# Altium footprint library Cyberdeck.PcbLib: 261 footprints (part 11 of 17)
Each footprint in its own frame and in the unit in brackets; x right, y up, seen from the top. Pads: shape width x height; smd on the part's side, far side on the other; paste and mask are expansions set on the pad; w line width, h text height; cw(c..) or ccw(c..) is an arc to the next point about the centre after c.
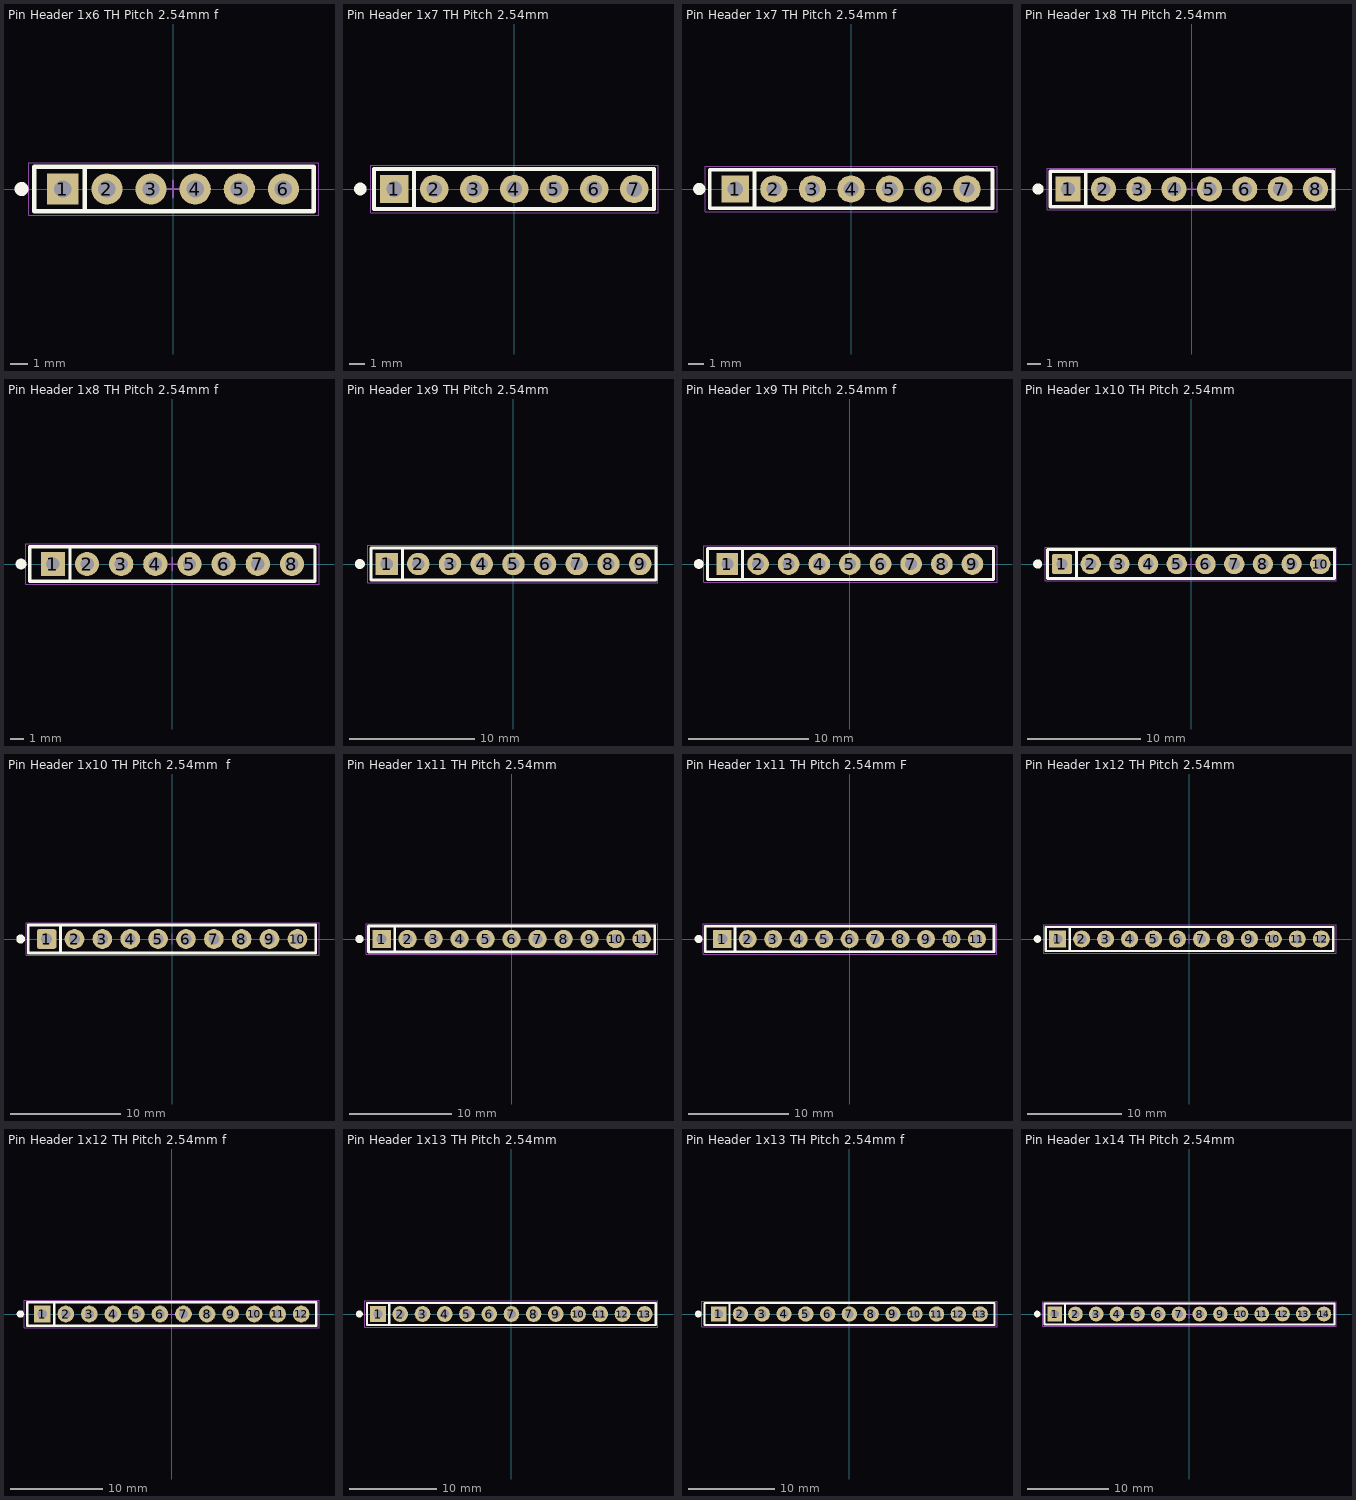
[diagram p10: the footprints below, top view; thin cyan lines are the x and y axes]

## Pin Header 1x6 TH Pitch 2.54mm f [mm] "PinHeader 1x6 TH Pitch 2.54mm female"
height 9.5
pads (6):
  rect 1.8x1.8 hole 1: 1(-6.35,0)
  round 1.8 hole 1: 2(-3.81,0) 3(-1.27,0) 4(1.27,0) 5(3.81,0) 6(6.35,0)
Top Overlay:
  circle w0.5: c-8.72,0 r0.15
  lines w0.254: -7.62,1.27 8.1,1.27 8.1,-1.27 -8,-1.27 -8,1.27 -5.08,1.27 -5.08,-1.27
Assembly Top:
  lines w0.1: -8.02,-1.27 -8.02,1.27 8.02,1.27 8.02,-1.27 -8.02,-1.27
Courtyard Top:
  lines w0.05: -8.3,-1.5 8.4,-1.5 8.4,1.5 -8.3,1.5 -8.3,-1.5
  lines w0.1: -0.5,0 0.5,0 ; 0,-0.5 0,0.5
3D body "DS1023-1x6SF11.stp": height 8.5, standoff -3, extent -8.02,-1.27 8.02,1.27

## Pin Header 1x7 TH Pitch 2.54mm [mm] "PinHeader 1x7 TH Pitch 2.54mm"
height 9.5
pads (7):
  rect 1.8x1.8 hole 1: 1(-7.62,0)
  round 1.8 hole 1: 2(-5.08,0) 3(-2.54,0) 4(0,0) 5(2.54,0) 6(5.08,0) 7(7.62,0)
Top Overlay:
  circle w0.5: c-9.77,0 r0.15
  lines w0.254: -6.35,-1.27 -6.35,1.27 -8.89,1.27 ; -8.89,1.27 8.89,1.27 8.89,-1.27 -8.89,-1.27 -8.89,1.27
Assembly Top:
  lines w0.1: -8.89,1.2 -8.82,1.27 8.89,1.27 8.89,-1.27 -8.89,-1.27 -8.89,1.27
Courtyard Top:
  lines w0.05: -9.12,-1.5 9.13,-1.5 9.13,1.5 -9.12,1.5 -9.12,-1.5
  lines w0.1: -0.5,0 0.5,0 ; 0,-0.5 0,0.5
3D body "DS1021-1x7SF11.stp": height 8.6, standoff -3, extent -8.89,-1.27 8.89,1.27

## Pin Header 1x7 TH Pitch 2.54mm f [mm] "PinHeader 1x7 TH Pitch 2.54mm female"
height 9.5
pads (7):
  rect 1.8x1.8 hole 1: 1(-7.62,0)
  round 1.8 hole 1: 2(-5.08,0) 3(-2.54,0) 4(0,0) 5(2.54,0) 6(5.08,0) 7(7.62,0)
Top Overlay:
  circle w0.5: c-9.99,0 r0.15
  lines w0.254: -8.89,1.27 9.3,1.27 9.3,-1.27 -9.3,-1.27 -9.3,1.27 -6.35,1.27 -6.35,-1.27
Assembly Top:
  lines w0.1: -9.29,-1.27 -9.29,1.27 9.29,1.27 9.29,-1.27 -9.29,-1.27
Courtyard Top:
  lines w0.05: -9.6,-1.5 -9.6,1.5 9.6,1.5 9.6,-1.5 -9.6,-1.5
  lines w0.1: -0.5,0 0.5,0 ; 0,-0.5 0,0.5
3D body "DS1023-1x7SF11.stp": height 8.5, standoff -3, extent -9.29,-1.27 9.29,1.27

## Pin Header 1x8 TH Pitch 2.54mm [mm] "PinHeader 1x8 TH Pitch 2.54mm"
height 9.5
pads (8):
  rect 1.8x1.8 hole 1: 1(-8.89,0)
  round 1.8 hole 1: 2(-6.35,0) 3(-3.81,0) 4(-1.27,0) 5(1.27,0) 6(3.81,0) 7(6.35,0) 8(8.89,0)
Top Overlay:
  circle w0.5: c-11.04,0 r0.15
  lines w0.254: -7.62,-1.27 -7.62,1.27 -10.16,1.27 ; -10.16,1.27 -10.16,-1.27 10.16,-1.27 10.16,1.27 -10.16,1.27
Assembly Top:
  lines w0.1: -10.16,-1.27 10.16,-1.27 10.16,1.27 -10.16,1.27 -10.16,-1.27
Courtyard Top:
  lines w0.05: -10.39,-1.5 10.36,-1.5 10.36,1.5 -10.39,1.5 -10.39,-1.5
  lines w0.1: -0.5,0 0.5,0 ; 0,-0.5 0,0.5
3D body "DS1021-1x8SF11.stp": height 8.6, standoff -3, extent -10.16,-1.27 10.16,1.27

## Pin Header 1x8 TH Pitch 2.54mm f [mm] "PinHeader 1x8 TH Pitch 2.54mm female"
height 9.5
pads (8):
  rect 1.8x1.8 hole 1: 1(-8.89,0)
  round 1.8 hole 1: 2(-6.35,0) 3(-3.81,0) 4(-1.27,0) 5(1.27,0) 6(3.81,0) 7(6.35,0) 8(8.89,0)
Top Overlay:
  circle w0.5: c-11.26,0 r0.15
  lines w0.254: -10.16,1.27 10.6,1.27 10.6,-1.27 -10.6,-1.27 -10.6,1.27 -7.62,1.27 -7.62,-1.27
Assembly Top:
  lines w0.1: -10.56,-1.27 10.56,-1.27 10.56,1.27 -10.56,1.27 -10.56,-1.27
Courtyard Top:
  lines w0.05: -10.9,-1.5 10.9,-1.5 10.9,1.5 -10.9,1.5 -10.9,-1.5
  lines w0.1: -0.5,0 0.5,0 ; 0,-0.5 0,0.5
3D body "DS1023-1x8SF11.stp": height 8.5, standoff -3, extent -10.56,-1.27 10.56,1.27

## Pin Header 1x9 TH Pitch 2.54mm [mm] "PinHeader 1x9 TH Pitch 2.54mm"
height 9.5
pads (9):
  rect 1.8x1.8 hole 1: 1(-10.16,0)
  round 1.8 hole 1: 2(-7.62,0) 3(-5.08,0) 4(-2.54,0) 5(0,0) 6(2.54,0) 7(5.08,0) 8(7.62,0) 9(10.16,0)
Top Overlay:
  circle w0.5: c-12.31,0 r0.15
  lines w0.254: -8.89,-1.27 -8.89,1.27 -11.43,1.27 ; -11.43,1.27 11.43,1.27 11.43,-1.27 -11.43,-1.27 -11.43,1.27
Assembly Top:
  lines w0.1: -11.43,-1.27 -11.43,1.27 11.43,1.27 11.43,-1.27 -11.43,-1.27
Courtyard Top:
  lines w0.05: -11.66,-1.5 11.59,-1.5 11.59,1.5 -11.66,1.5 -11.66,-1.5
  lines w0.1: -0.5,0 0.5,0 ; 0,-0.5 0,0.5
3D body "DS1021-1x9SF11.stp": height 8.6, standoff -3, extent -11.43,-1.27 11.43,1.27

## Pin Header 1x9 TH Pitch 2.54mm f [mm] "PinHeader 1x9 TH Pitch 2.54mm female"
height 9.5
pads (9):
  rect 1.8x1.8 hole 1: 1(-10.16,0)
  round 1.8 hole 1: 2(-7.62,0) 3(-5.08,0) 4(-2.54,0) 5(0,0) 6(2.54,0) 7(5.08,0) 8(7.62,0) 9(10.16,0)
Top Overlay:
  circle w0.5: c-12.53,0 r0.15
  lines w0.254: -11.43,1.27 11.9,1.27 11.9,-1.27 -11.8,-1.27 -11.8,1.27 -8.89,1.27 -8.89,-1.27
Assembly Top:
  lines w0.1: -11.83,-1.27 11.83,-1.27 11.83,1.27 -11.83,1.27 -11.83,-1.27
Courtyard Top:
  lines w0.05: -12.1,-1.5 -12.1,1.5 12.2,1.5 12.2,-1.5 -12.1,-1.5
  lines w0.1: -0.5,0 0.5,0 ; 0,-0.5 0,0.5
3D body "DS1023-1x9SF11.stp": height 8.5, standoff -3, extent -11.83,-1.27 11.83,1.27

## Pin Header 1x10 TH Pitch 2.54mm [mm] "PinHeader 1x10 TH Pitch 2.54mm"
height 9.5
pads (10):
  rrect25% 1.8x1.8 hole 1: 1(-11.43,0)
  round 1.8 hole 1: 2(-8.89,0) 3(-6.35,0) 4(-3.81,0) 5(-1.27,0) 6(1.27,0) 7(3.81,0) 8(6.35,0) 9(8.89,0) 10(11.43,0)
Top Overlay:
  circle w0.5: c-13.58,0 r0.15
  lines w0.254: -10.16,-1.27 -10.16,1.27 -12.7,1.27 ; -12.7,1.27 12.7,1.27 12.7,-1.27 -12.7,-1.27 -12.7,1.27
Assembly Top:
  lines w0.1: -12.7,-1.27 12.7,-1.27 12.7,1.27 -12.7,1.27 -12.7,-1.27
Courtyard Top:
  lines w0.05: -12.93,-1.5 12.82,-1.5 12.82,1.5 -12.93,1.5 -12.93,-1.5
  lines w0.1: -0.5,0 0.5,0 ; 0,-0.5 0,0.5
3D body "DS1021-1x10SF11.stp": height 8.6, standoff -3, extent -12.7,-1.27 12.7,1.27

## Pin Header 1x10 TH Pitch 2.54mm  f [mm] "PinHeader 1x10 TH Pitch 2.54mm Female"
height 9.5
pads (10):
  rrect25% 1.8x1.8 hole 1: 1(-11.43,0)
  round 1.8 hole 1: 2(-8.89,0) 3(-6.35,0) 4(-3.81,0) 5(-1.27,0) 6(1.27,0) 7(3.81,0) 8(6.35,0) 9(8.89,0) 10(11.43,0)
Top Overlay:
  circle w0.5: c-13.8,0 r0.15
  lines w0.254: -12.7,1.27 13.1,1.27 13.1,-1.27 -13.1,-1.27 -13.1,1.27 -10.16,1.27 -10.16,-1.27
Assembly Top:
  lines w0.1: -13.1,-1.27 13.1,-1.27 13.1,1.27 -13.1,1.27 -13.1,-1.27
Courtyard Top:
  lines w0.05: -13.3,-1.5 13.4,-1.5 13.4,1.5 -13.3,1.5 -13.3,-1.5
  lines w0.1: -0.5,0 0.5,0 ; 0,-0.5 0,0.5
3D body "DS1023-1x10SF11.stp": height 8.5, standoff -3, extent -13.1,-1.27 13.1,1.27

## Pin Header 1x11 TH Pitch 2.54mm [mm] "PinHeader 1x11 TH Pitch 2.54mm"
height 9.5
pads (11):
  rect 1.8x1.8 hole 1: 1(-12.7,0)
  round 1.8 hole 1: 2(-10.16,0) 3(-7.62,0) 4(-5.08,0) 5(-2.54,0) 6(0,0) 7(2.54,0) 8(5.08,0) 9(7.62,0) 10(10.16,0) 11(12.7,0)
Top Overlay:
  circle w0.5: c-14.85,0 r0.15
  lines w0.254: -11.43,-1.27 -11.43,1.27 -13.97,1.27 ; -13.97,1.27 13.97,1.27 13.97,-1.27 -13.97,-1.27 -13.97,1.27
Assembly Top:
  lines w0.1: -13.97,-1.27 13.97,-1.27 13.97,1.27 -13.97,1.27 -13.97,-1.27
Courtyard Top:
  lines w0.05: -14.2,-1.5 -14.2,1.5 14.3,1.5 14.3,-1.5 -14.2,-1.5
  lines w0.1: -0.5,0 0.5,0 ; 0,-0.5 0,0.5
3D body "DS1021-1x10SF11.stp": height 8.6, standoff -3, extent -13.97,-1.27 11.43,1.27
3D body "DS1021-1x1SF11.stp": height 8.6, standoff -3, extent 11.43,-1.27 13.97,1.27

## Pin Header 1x11 TH Pitch 2.54mm F [mm] "PinHeader 1x11 TH Pitch 2.54mm female"
height 9.5
pads (11):
  rect 1.8x1.8 hole 1: 1(-12.7,0)
  round 1.8 hole 1: 2(-10.16,0) 3(-7.62,0) 4(-5.08,0) 5(-2.54,0) 6(0,0) 7(2.54,0) 8(5.08,0) 9(7.62,0) 10(10.16,0) 11(12.7,0)
Top Overlay:
  circle w0.5: c-15.07,0 r0.15
  lines w0.254: -13.97,1.27 14.4,1.27 14.4,-1.27 -14.4,-1.27 -14.4,1.27 -11.43,1.27 -11.43,-1.27
Assembly Top:
  lines w0.1: -14.37,-1.27 14.37,-1.27 14.37,1.27 -14.37,1.27 -14.37,-1.27
Courtyard Top:
  lines w0.05: -14.6,-1.5 -14.6,1.5 14.7,1.5 14.7,-1.5 -14.6,-1.5
  lines w0.1: -0.5,0 0.5,0 ; 0,-0.5 0,0.5
3D body "DS1023-1x10SF11.stp": height 8.5, standoff -3, extent -14.37,-1.27 11.83,1.27
3D body "DS1023-1x1SF11.stp": height 8.5, standoff -3, extent 11.03,-1.27 14.37,1.27

## Pin Header 1x12 TH Pitch 2.54mm [mm] "PinHeader 1x12 TH Pitch 2.54mm"
height 9.5
pads (12):
  rect 1.8x1.8 hole 1: 1(-13.97,0)
  round 1.8 hole 1: 2(-11.43,0) 3(-8.89,0) 4(-6.35,0) 5(-3.81,0) 6(-1.27,0) 7(1.27,0) 8(3.81,0) 9(6.35,0) 10(8.89,0) 11(11.43,0) 12(13.97,0)
Top Overlay:
  circle w0.5: c-16.12,0 r0.15
  lines w0.254: -12.7,-1.27 -12.7,1.27 -15.24,1.27 ; -15.24,1.27 -15.24,-1.27 15.24,-1.27 15.24,1.27 -15.24,1.27
Assembly Top:
  lines w0.1: -15.24,-1.27 15.24,-1.27 15.24,1.27 -15.24,1.27 -15.24,-1.27
Courtyard Top:
  lines w0.05: -15.47,-1.5 -15.47,1.5 15.53,1.5 15.53,-1.5 -15.47,-1.5
  lines w0.1: -0.5,0 0.5,0 ; 0,-0.5 0,0.5
3D body "DS1021-1x6SF11.stp": height 8.6, standoff -3, extent 0,-1.27 15.24,1.27
3D body "DS1021-1x6SF11.stp": height 8.6, standoff -3, extent -15.24,-1.27 0,1.27

## Pin Header 1x12 TH Pitch 2.54mm f [mm] "PinHeader 1x12 TH Pitch 2.54mm female"
height 9.5
pads (12):
  rect 1.8x1.8 hole 1: 1(-13.97,0)
  round 1.8 hole 1: 2(-11.43,0) 3(-8.89,0) 4(-6.35,0) 5(-3.81,0) 6(-1.27,0) 7(1.27,0) 8(3.81,0) 9(6.35,0) 10(8.89,0) 11(11.43,0) 12(13.97,0)
Top Overlay:
  circle w0.5: c-16.34,0 r0.15
  lines w0.254: -15.24,1.27 15.6,1.27 15.6,-1.27 -15.6,-1.27 -15.6,1.27 -12.7,1.27 -12.7,-1.27
Assembly Top:
  lines w0.1: -15.64,-1.27 15.64,-1.27 15.64,1.27 -15.64,1.27 -15.64,-1.27
Courtyard Top:
  lines w0.05: -15.9,-1.5 -15.9,1.5 15.9,1.5 15.9,-1.5 -15.9,-1.5
  lines w0.1: -0.5,0 0.5,0 ; 0,-0.5 0,0.5
3D body "DS1023-1x6SF11.stp": height 8.5, standoff -3, extent -0.4,-1.27 15.64,1.27
3D body "DS1023-1x6SF11.stp": height 8.5, standoff -3, extent -15.64,-1.27 0.4,1.27

## Pin Header 1x13 TH Pitch 2.54mm [mm] "PinHeader 1x13 TH Pitch 2.54mm"
height 9.5
pads (13):
  rect 1.8x1.8 hole 1: 1(-15.24,0)
  round 1.8 hole 1: 2(-12.7,0) 3(-10.16,0) 4(-7.62,0) 5(-5.08,0) 6(-2.54,0) 7(0,0) 8(2.54,0) 9(5.08,0) 10(7.62,0) 11(10.16,0) 12(12.7,0) 13(15.24,0)
Top Overlay:
  circle w0.5: c-17.39,0 r0.15
  lines w0.254: -13.97,-1.27 -13.97,1.27 -16.51,1.27 ; -16.51,1.27 16.51,1.27 16.51,-1.27 -16.51,-1.27 -16.51,1.27
Assembly Top:
  lines w0.1: -16.51,-1.27 -16.51,1.27 16.51,1.27 16.51,-1.27 -16.51,-1.27
Courtyard Top:
  lines w0.05: -16.74,-1.5 -16.74,1.5 16.76,1.5 16.76,-1.5 -16.74,-1.5
  lines w0.1: -0.5,0 0.5,0 ; 0,-0.5 0,0.5
3D body "DS1021-1x7SF11.stp": height 8.6, standoff -3, extent -1.27,-1.27 16.51,1.27
3D body "DS1021-1x6SF11.stp": height 8.6, standoff -3, extent -16.51,-1.27 -1.27,1.27

## Pin Header 1x13 TH Pitch 2.54mm f [mm] "PinHeader 1x13 TH Pitch 2.54mm female"
height 9.5
pads (13):
  rect 1.8x1.8 hole 1: 1(-15.24,0)
  round 1.8 hole 1: 2(-12.7,0) 3(-10.16,0) 4(-7.62,0) 5(-5.08,0) 6(-2.54,0) 7(0,0) 8(2.54,0) 9(5.08,0) 10(7.62,0) 11(10.16,0) 12(12.7,0) 13(15.24,0)
Top Overlay:
  circle w0.5: c-17.61,0 r0.15
  lines w0.254: -16.51,1.27 16.9,1.27 16.9,-1.27 -16.9,-1.27 -16.9,1.27 -13.97,1.27 -13.97,-1.27
Assembly Top:
  lines w0.1: -16.91,-1.27 16.91,-1.27 16.91,1.27 -16.91,1.27 -16.91,-1.27
Courtyard Top:
  lines w0.05: -17.2,-1.5 17.2,-1.5 17.2,1.5 -17.2,1.5 -17.2,-1.5
  lines w0.1: -0.5,0 0.5,0 ; 0,-0.5 0,0.5
3D body "DS1023-1x6SF11.stp": height 8.5, standoff -3, extent -16.91,-1.27 -0.87,1.27
3D body "DS1023-1x7SF11.stp": height 8.5, standoff -3, extent -1.67,-1.27 16.91,1.27

## Pin Header 1x14 TH Pitch 2.54mm [mm] "PinHeader 1x14 TH Pitch 2.54mm"
height 9.5
pads (14):
  rect 1.8x1.8 hole 1: 1(-16.51,0)
  round 1.8 hole 1: 2(-13.97,0) 3(-11.43,0) 4(-8.89,0) 5(-6.35,0) 6(-3.81,0) 7(-1.27,0) 8(1.27,0) 9(3.81,0) 10(6.35,0) 11(8.89,0) 12(11.43,0) 13(13.97,0) 14(16.51,0)
Top Overlay:
  circle w0.5: c-18.66,0 r0.15
  lines w0.254: -15.24,-1.27 -15.24,1.27 -17.78,1.27 ; -17.78,1.27 -17.78,-1.27 17.78,-1.27 17.78,1.27 -17.78,1.27
Assembly Top:
  lines w0.1: -17.78,-1.27 -17.78,1.27 17.78,1.27 17.78,-1.27 -17.78,-1.27
Courtyard Top:
  lines w0.05: -18.01,-1.5 17.99,-1.5 17.99,1.5 -18.01,1.5 -18.01,-1.5
  lines w0.1: -0.5,0 0.5,0 ; 0,-0.5 0,0.5
3D body "DS1021-1x7SF11.stp": height 8.6, standoff -3, extent 0,-1.27 17.78,1.27
3D body "DS1021-1x7SF11.stp": height 8.6, standoff -3, extent -17.78,-1.27 0,1.27